# Altium footprint library Reflow3D1411sep.PcbLib: 657 footprints (part 31 of 42)
Each footprint in its own frame and in the unit in brackets; x right, y up, seen from the top. Pads: shape width x height; smd on the part's side, far side on the other; paste and mask are expansions set on the pad; w line width, h text height; cw(c..) or ccw(c..) is an arc to the next point about the centre after c.
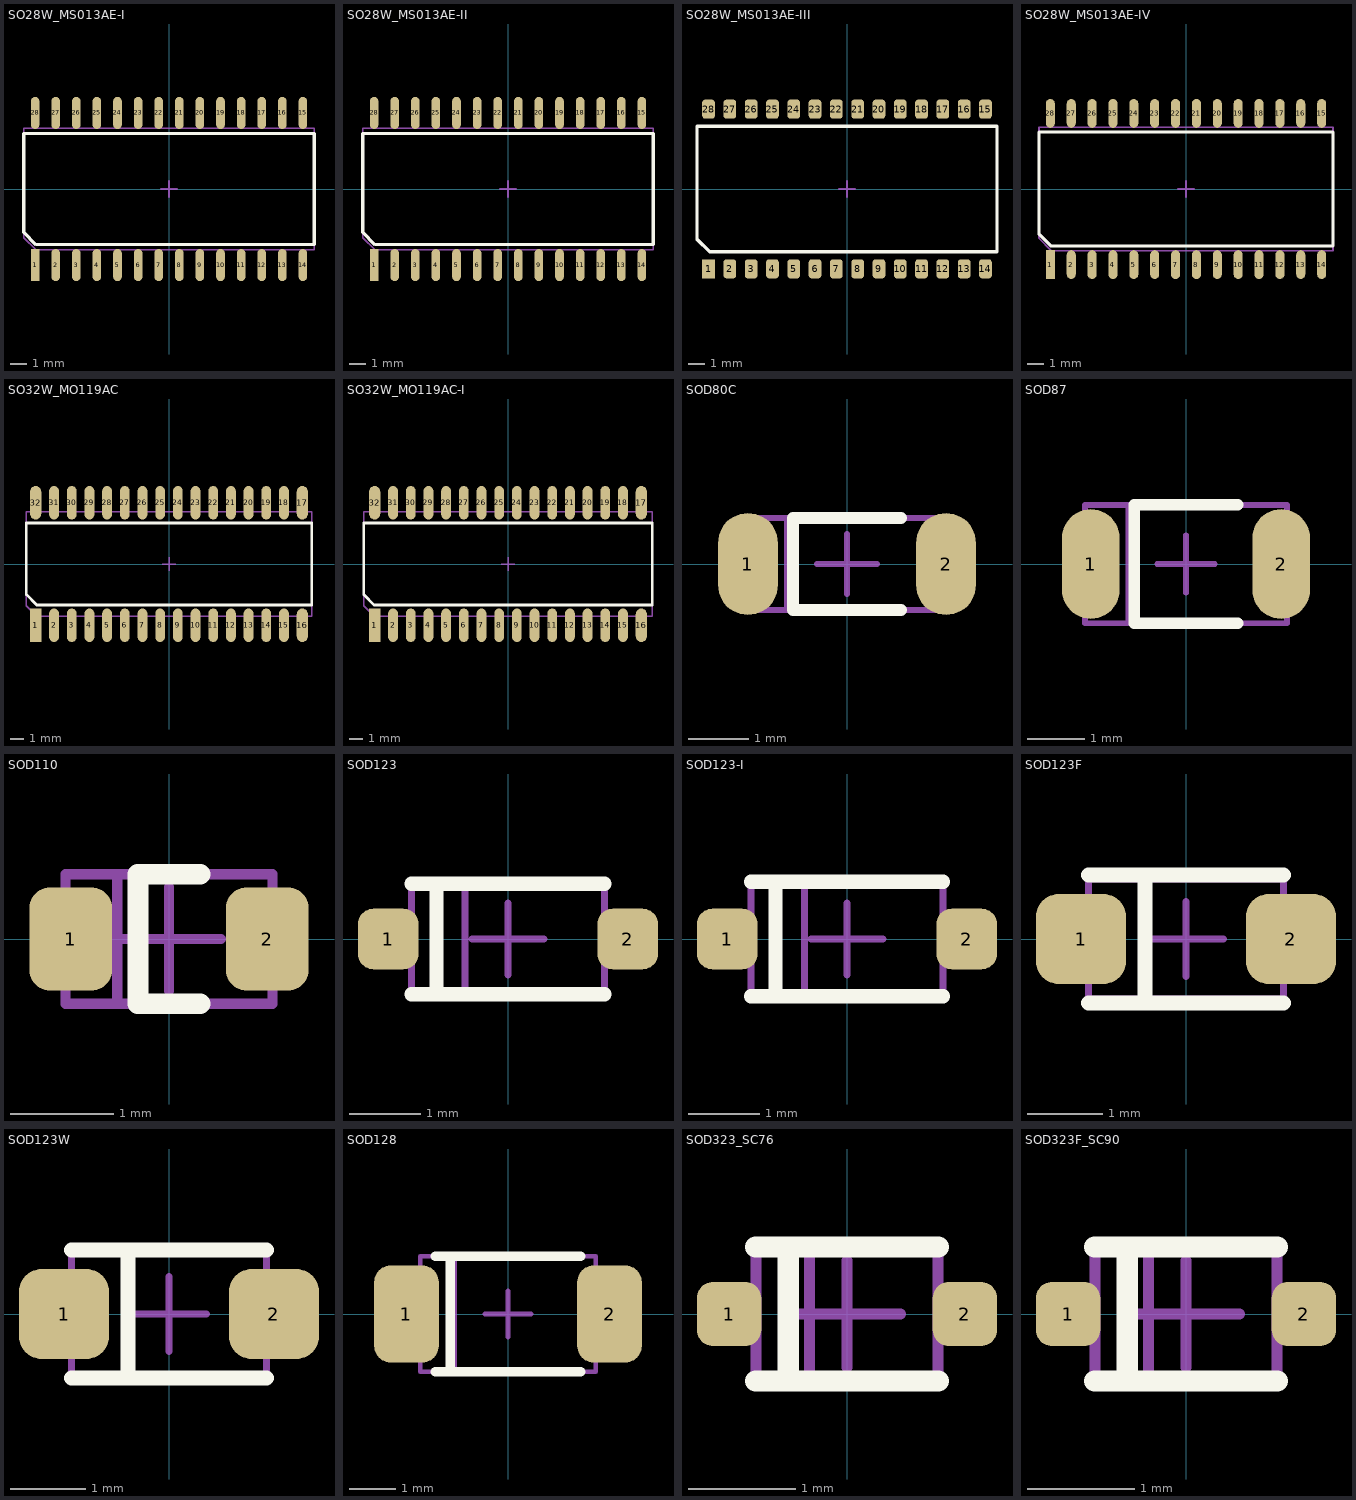
[diagram p30: the footprints below, top view; thin cyan lines are the x and y axes]

## SO28W_MS013AE-I [mm] "www.allegromicro.com, pkgso1.pdf; www.maxim-ic.com, 90-0109.PDF; www.jedec.org, MS-013E.pdf"
height 2.4
pads (28):
  rect 0.53x1.98 smd mask+0.075: 1(-8.255,-4.685)
  oval 0.53x1.98 smd mask+0.075: 2(-6.985,-4.685) 3(-5.715,-4.685) 4(-4.445,-4.685) 5(-3.175,-4.685) 6(-1.905,-4.685) 7(-0.635,-4.685) 8(0.635,-4.685) 9(1.905,-4.685) 10(3.175,-4.685) 11(4.445,-4.685) 12(5.715,-4.685) 13(6.985,-4.685) 14(8.255,-4.685) 15(8.255,4.685) 16(6.985,4.685) 17(5.715,4.685) 18(4.445,4.685) 19(3.175,4.685) 20(1.905,4.685) 21(0.635,4.685) 22(-0.635,4.685) 23(-1.905,4.685) 24(-3.175,4.685) 25(-4.445,4.685) 26(-5.715,4.685) 27(-6.985,4.685) 28(-8.255,4.685)
Top Overlay:
  lines w0.2: -8.95,-2.675 -8.2,-3.425 8.95,-3.425 8.95,3.425 -8.95,3.425 -8.95,-2.675
Mechanical 13:
  lines w0.1: -8.95,-3 -8.2,-3.75 8.95,-3.75 8.95,3.75 -8.95,3.75 -8.95,-3
Mechanical 15:
  lines w0.1: -0.5,0 0.5,0 ; 0,-0.5 0,0.5
3D body: height 2.65, standoff 0, extent -9.05,-3.8 9.05,3.8

## SO28W_MS013AE-II [mm] "www.maxim-ic.com, 21-0042.PDF, 90-0109.PDF"
height 2.5
pads (28):
  rect 0.53x1.98 smd mask+0.075: 1(-8.255,-4.685)
  oval 0.53x1.98 smd mask+0.075: 2(-6.985,-4.685) 3(-5.715,-4.685) 4(-4.445,-4.685) 5(-3.175,-4.685) 6(-1.905,-4.685) 7(-0.635,-4.685) 8(0.635,-4.685) 9(1.905,-4.685) 10(3.175,-4.685) 11(4.445,-4.685) 12(5.715,-4.685) 13(6.985,-4.685) 14(8.255,-4.685) 15(8.255,4.685) 16(6.985,4.685) 17(5.715,4.685) 18(4.445,4.685) 19(3.175,4.685) 20(1.905,4.685) 21(0.635,4.685) 22(-0.635,4.685) 23(-1.905,4.685) 24(-3.175,4.685) 25(-4.445,4.685) 26(-5.715,4.685) 27(-6.985,4.685) 28(-8.255,4.685)
Top Overlay:
  lines w0.2: -8.95,-2.675 -8.2,-3.425 8.95,-3.425 8.95,3.425 -8.95,3.425 -8.95,-2.675
Mechanical 13:
  lines w0.1: -8.95,-3 -8.2,-3.75 8.95,-3.75 8.95,3.75 -8.95,3.75 -8.95,-3
Mechanical 15:
  lines w0.1: -0.5,0 0.5,0 ; 0,-0.5 0,0.5
3D body: height 2.65, standoff 0, extent -9.05,-3.8 9.05,3.8

## SO28W_MS013AE-III [mm] "www.linear.com, SO_28_05-08-1620.pdf"
height 2.5
pads (28):
  rect 0.76x1.14 smd mask+0.075: 1(-8.255,-4.763)
  rrect50% 0.76x1.14 smd mask+0.075: 2(-6.985,-4.763) 3(-5.715,-4.763) 4(-4.445,-4.763) 5(-3.175,-4.763) 6(-1.905,-4.763) 7(-0.635,-4.763) 8(0.635,-4.763) 9(1.905,-4.763) 10(3.175,-4.763) 11(4.445,-4.763) 12(5.715,-4.763) 13(6.985,-4.763) 14(8.255,-4.763) 15(8.255,4.763) 16(6.985,4.763) 17(5.715,4.763) 18(4.445,4.763) 19(3.175,4.763) 20(1.905,4.763) 21(0.635,4.763) 22(-0.635,4.763) 23(-1.905,4.763) 24(-3.175,4.763) 25(-4.445,4.763) 26(-5.715,4.763) 27(-6.985,4.763) 28(-8.255,4.763)
Top Overlay:
  lines w0.2: -8.945,-2.995 -8.945,3.745 8.945,3.745 8.945,-3.745 -8.195,-3.745 -8.945,-2.995
Mechanical 13:
  lines w0.1: -8.945,-2.995 -8.195,-3.745 8.945,-3.745 8.945,3.745 -8.945,3.745 -8.945,-2.995
Mechanical 15:
  lines w0.1: -0.5,0 0.5,0 ; 0,-0.5 0,0.5
3D body: height 2.64, standoff 0, extent -9.04,-3.8 9.04,3.8

## SO28W_MS013AE-IV [mm] "www.fairchildsemi.com, M28B.pdf"
height 2.4
pads (28):
  rect 0.55x1.75 smd mask+0.075: 1(-8.255,-4.6)
  oval 0.55x1.75 smd mask+0.075: 2(-6.985,-4.6) 3(-5.715,-4.6) 4(-4.445,-4.6) 5(-3.175,-4.6) 6(-1.905,-4.6) 7(-0.635,-4.6) 8(0.635,-4.6) 9(1.905,-4.6) 10(3.175,-4.6) 11(4.445,-4.6) 12(5.715,-4.6) 13(6.985,-4.6) 14(8.255,-4.6) 15(8.255,4.6) 16(6.985,4.6) 17(5.715,4.6) 18(4.445,4.6) 19(3.175,4.6) 20(1.905,4.6) 21(0.635,4.6) 22(-0.635,4.6) 23(-1.905,4.6) 24(-3.175,4.6) 25(-4.445,4.6) 26(-5.715,4.6) 27(-6.985,4.6) 28(-8.255,4.6)
Top Overlay:
  lines w0.2: -8.95,-2.725 -8.2,-3.475 8.95,-3.475 8.95,3.475 -8.95,3.475 -8.95,-2.725
Mechanical 13:
  lines w0.1: -8.95,-3 -8.2,-3.75 8.95,-3.75 8.95,3.75 -8.95,3.75 -8.95,-3
Mechanical 15:
  lines w0.1: -0.5,0 0.5,0 ; 0,-0.5 0,0.5
3D body: height 2.65, standoff 0, extent -9.05,-3.8 9.05,3.8

## SO32W_MO119AC [mm] "www.nxp.com, sot287-1_po.pdf, SOT287-1_fp_reflow.pdf"
height 2.5
pads (32):
  rect 0.8x2.4 smd mask+0.075: 1(-9.575,-4.4)
  oval 0.7x2.4 smd mask+0.075: 2(-8.255,-4.4) 3(-6.985,-4.4) 4(-5.715,-4.4) 5(-4.445,-4.4) 6(-3.175,-4.4) 7(-1.905,-4.4) 8(-0.635,-4.4) 9(0.635,-4.4) 10(1.905,-4.4) 11(3.175,-4.4) 12(4.445,-4.4) 13(5.715,-4.4) 14(6.985,-4.4) 15(8.255,-4.4) 18(8.255,4.4) 19(6.985,4.4) 20(5.715,4.4) 21(4.445,4.4) 22(3.175,4.4) 23(1.905,4.4) 24(0.635,4.4) 25(-0.635,4.4) 26(-1.905,4.4) 27(-3.175,4.4) 28(-4.445,4.4) 29(-5.715,4.4) 30(-6.985,4.4) 31(-8.255,4.4)
  oval 0.8x2.4 smd mask+0.075: 16(9.575,-4.4) 17(9.575,4.4) 32(-9.575,4.4)
Top Overlay:
  lines w0.2: -10.25,-2.2 -10.25,2.95 10.25,2.95 10.25,-2.95 -9.5,-2.95 -10.25,-2.2
Mechanical 13:
  lines w0.1: -10.25,-3 -10.25,3.75 10.25,3.75 10.25,-3.75 -9.5,-3.75 -10.25,-3
Mechanical 15:
  lines w0.1: -0.5,0 0.5,0 ; 0,-0.5 0,0.5
3D body: height 2.65, standoff 0, extent -10.35,-3.8 10.35,3.8

## SO32W_MO119AC-I [mm] "www.cypress.com, 51-85127.pdf"
height 2.41
pads (32):
  rect 0.8x2.4 smd mask+0.075: 1(-9.575,-4.4)
  oval 0.7x2.4 smd mask+0.075: 2(-8.255,-4.4) 3(-6.985,-4.4) 4(-5.715,-4.4) 5(-4.445,-4.4) 6(-3.175,-4.4) 7(-1.905,-4.4) 8(-0.635,-4.4) 9(0.635,-4.4) 10(1.905,-4.4) 11(3.175,-4.4) 12(4.445,-4.4) 13(5.715,-4.4) 14(6.985,-4.4) 15(8.255,-4.4) 18(8.255,4.4) 19(6.985,4.4) 20(5.715,4.4) 21(4.445,4.4) 22(3.175,4.4) 23(1.905,4.4) 24(0.635,4.4) 25(-0.635,4.4) 26(-1.905,4.4) 27(-3.175,4.4) 28(-4.445,4.4) 29(-5.715,4.4) 30(-6.985,4.4) 31(-8.255,4.4)
  oval 0.8x2.4 smd mask+0.075: 16(9.575,-4.4) 17(9.575,4.4) 32(-9.575,4.4)
Top Overlay:
  lines w0.2: -10.365,-2.2 -9.615,-2.95 10.365,-2.95 10.365,2.95 -10.365,2.95 -10.365,-2.2
Mechanical 13:
  lines w0.1: -10.365,-3.005 -9.615,-3.755 10.365,-3.755 10.365,3.755 -10.365,3.755 -10.365,-3.005
Mechanical 15:
  lines w0.1: -0.5,0 0.5,0 ; 0,-0.5 0,0.5
3D body: height 2.54, standoff 0, extent -10.455,-3.795 10.445,3.795

## SOD80C [mm] "www.nxp.com, SOD080C_po.pdf, FOOTPRINT-SOD80C.pdf"
height 1.53
pads (2):
  oval 1x1.7 smd mask+0.075: 1(-1.65,0) 2(1.65,0)
Top Overlay:
  lines w0.2: -0.9,-0.765 0.9,-0.765 ; -0.9,-0.76 -0.9,0.76 ; -0.9,0.765 0.9,0.765
Mechanical 13:
  lines w0.1: -1,-0.76 -1,0.76 ; -1.75,-0.765 1.75,-0.765 1.75,0.765 -1.75,0.765 -1.75,-0.765
Mechanical 15:
  lines w0.1: -0.5,0 0.5,0 ; 0,-0.5 0,0.5
3D body: height 1.6, standoff 0, extent -1.85,-0.8 1.85,0.8

## SOD87 [mm] "www.nxp.com, sod087_po.pdf, SOD87_fr.pdf"
height 2.05
pads (2):
  oval 1x1.9 smd mask+0.075: 1(-1.65,0) 2(1.65,0)
Top Overlay:
  lines w0.2: 0.9,-1.025 -0.9,-1.025 -0.9,1.025 0.9,1.025
Mechanical 13:
  lines w0.1: -1,-1.025 -1,1.025 ; -1.75,-1.025 -1.75,1.025 1.75,1.025 1.75,-1.025 -1.75,-1.025
Mechanical 15:
  lines w0.1: -0.5,0 0.5,0 ; 0,-0.5 0,0.5
3D body: height 2.1, standoff 0, extent -1.85,-1.05 1.85,1.05

## SOD110 [mm] "www.nxp.com, sod110_po.pdf, SOD110_fr.pdf"
height 1.5
pads (2):
  rrect50% 0.8x1 smd mask+0.075: 1(-0.95,0) 2(0.95,0)
Top Overlay:
  lines w0.2: 0.3,-0.625 -0.3,-0.625 -0.3,0.625 0.3,0.625
Mechanical 13:
  lines w0.1: -0.5,-0.625 -0.5,0.625 ; -1,-0.625 1,-0.625 1,0.625 -1,0.625 -1,-0.625
Mechanical 15:
  lines w0.1: -0.5,0 0.5,0 ; 0,-0.5 0,0.5
3D body: height 1.6, standoff 0, extent -1.05,-0.7 1.05,0.7

## SOD123 [mm] "www.vishay.com, ba782v.pdf; www.onsemi.com, 425-04.PDF"
height 1
pads (2):
  rrect50% 0.85x0.85 smd mask+0.075: 1(-1.675,0) 2(1.675,0)
Top Overlay:
  lines w0.2: -1.35,-0.775 1.35,-0.775 ; -1.35,0.775 1.35,0.775 ; -1,-0.775 -1,0.775
Mechanical 13:
  lines w0.1: -0.6,-0.775 -0.6,0.775 ; -1.35,-0.775 -1.35,0.775 1.35,0.775 1.35,-0.775 -1.35,-0.775
Mechanical 15:
  lines w0.1: -0.5,0 0.5,0 ; 0,-0.5 0,0.5
3D body: height 1.35, standoff 0, extent -1.425,-0.85 1.425,0.85

## SOD123-I [mm] "www.vishay.com, ba782v.pdf; www.onsemi.com, 425-04.PDF"
height 1.17
pads (2):
  rrect50% 0.85x0.85 smd mask+0.075: 1(-1.675,0) 2(1.675,0)
Top Overlay:
  lines w0.2: -1.345,-0.8 1.345,-0.8 ; -1.345,0.8 1.345,0.8 ; -1,-0.8 -1,0.8
Mechanical 13:
  lines w0.1: -0.595,-0.8 -0.595,0.8 ; -1.345,-0.8 1.345,-0.8 1.345,0.8 -1.345,0.8 -1.345,-0.8
Mechanical 15:
  lines w0.1: -0.5,0 0.5,0 ; 0,-0.5 0,0.5
3D body: height 1.35, standoff 0, extent -1.42,-0.9 1.42,0.9

## SOD123F [mm] "www.nxp.com, sod123f_po.pdf, SOD123W_fr.pdf"
height 1.1
pads (2):
  rrect50% 1.2x1.2 smd mask+0.075: 1(-1.4,0) 2(1.4,0)
Top Overlay:
  lines w0.2: -1.3,-0.85 1.3,-0.85 ; -1.3,0.85 1.3,0.85 ; -0.55,-0.85 -0.55,0.85
Mechanical 13:
  lines w0.1: -0.55,-0.8 -0.55,0.8 ; -1.3,-0.8 -1.3,0.8 1.3,0.8 1.3,-0.8 -1.3,-0.8
Mechanical 15:
  lines w0.1: -0.5,0 0.5,0 ; 0,-0.5 0,0.5
3D body: height 1.2, standoff 0, extent -1.35,-0.85 1.35,0.85

## SOD123W [mm] "www.nxp.com, sod123w_po.pdf, SOD123W_fr.pdf"
height 1
pads (2):
  rrect50% 1.2x1.2 smd mask+0.075: 1(-1.4,0) 2(1.4,0)
Top Overlay:
  lines w0.2: -1.3,-0.85 1.3,-0.85 ; -1.3,0.85 1.3,0.85 ; -0.55,-0.85 -0.55,0.85
Mechanical 13:
  lines w0.1: -0.55,-0.85 -0.55,0.85 ; -1.3,-0.85 -1.3,0.85 1.3,0.85 1.3,-0.85 -1.3,-0.85
Mechanical 15:
  lines w0.1: -0.5,0 0.5,0 ; 0,-0.5 0,0.5
3D body: height 1.1, standoff 0, extent -1.4,-0.95 1.4,0.95

## SOD128 [mm] "www.nxp.com, sod128_po.pdf, SOD128_fr.pdf"
height 1
pads (2):
  rrect50% 1.4x2.1 smd mask+0.075: 1(-2.2,0) 2(2.2,0)
Top Overlay:
  lines w0.2: -1.575,-1.25 1.575,-1.25 ; -1.575,1.25 1.575,1.25 ; -1.25,-1.25 -1.25,1.25
Mechanical 13:
  lines w0.1: -1.15,-1.25 -1.15,1.25 ; -1.9,-1.25 -1.9,1.25 1.9,1.25 1.9,-1.25 -1.9,-1.25
Mechanical 15:
  lines w0.1: -0.5,0 0.5,0 ; 0,-0.5 0,0.5
3D body: height 1.1, standoff 0, extent -2,-1.35 2,1.35

## SOD323_SC76 [mm] "www.nxp.com, sod323_po.pdf, SOD323_fr.pdf"
height 0.95
pads (2):
  rrect50% 0.6x0.6 smd mask+0.075: 1(-1.1,0) 2(1.1,0)
Top Overlay:
  lines w0.2: -0.85,-0.625 0.85,-0.625 ; -0.85,0.625 0.85,0.625 ; -0.55,-0.625 -0.55,0.625
Mechanical 13:
  lines w0.1: -0.35,-0.625 -0.35,0.625 ; -0.85,-0.625 -0.85,0.625 0.85,0.625 0.85,-0.625 -0.85,-0.625
Mechanical 15:
  lines w0.1: -0.5,0 0.5,0 ; 0,-0.5 0,0.5
3D body: height 1.1, standoff 0, extent -0.9,-0.675 0.9,0.675

## SOD323F_SC90 [mm] "www.nxp.com, SOD323F.pdf, SOD323F_fr.pdf"
height 0.73
pads (2):
  rrect50% 0.6x0.6 smd mask+0.075: 1(-1.1,0) 2(1.1,0)
Top Overlay:
  lines w0.2: -0.85,-0.625 0.85,-0.625 ; -0.85,0.625 0.85,0.625 ; -0.55,-0.625 -0.55,0.625
Mechanical 13:
  lines w0.1: -0.35,-0.625 -0.35,0.625 ; -0.85,-0.625 -0.85,0.625 0.85,0.625 0.85,-0.625 -0.85,-0.625
Mechanical 15:
  lines w0.1: -0.5,0 0.5,0 ; 0,-0.5 0,0.5
3D body: height 0.8, standoff 0, extent -0.9,-0.675 0.9,0.675